# Altium footprint library mastermind.PCBLIB: 1061 footprints (part 19 of 67)
Each footprint in its own frame and in the unit in brackets; x right, y up, seen from the top. Pads: shape width x height; smd on the part's side, far side on the other; paste and mask are expansions set on the pad; w line width, h text height; cw(c..) or ccw(c..) is an arc to the next point about the centre after c.
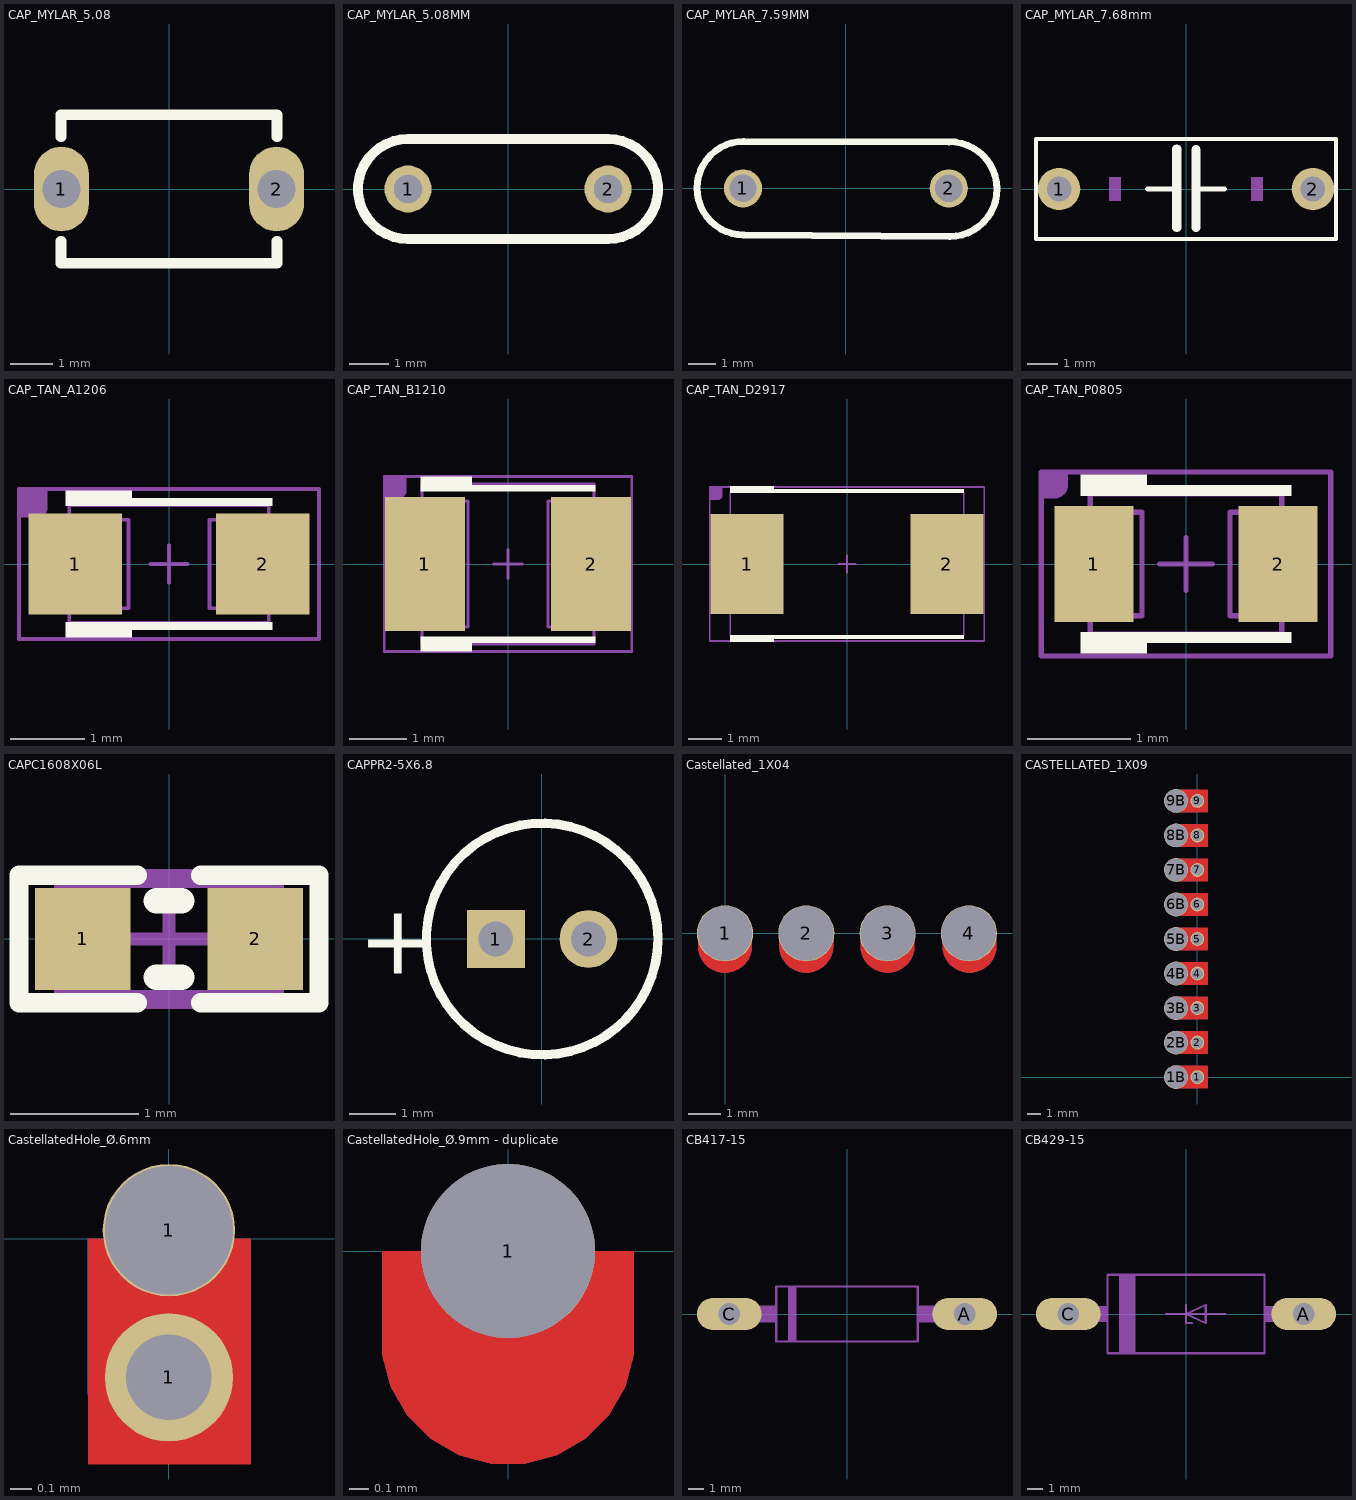
[diagram p18: the footprints below, top view; thin cyan lines are the x and y axes]

## CAP_MYLAR_5.08 [mm]
pads (2):
  oval 1.3x2 hole 0.9 paste-2539.97 mask+0.102: 1(-2.54,0) 2(2.54,0)
Top Overlay:
  lines w0.254: -2.55,-1.231 -2.55,-1.75 2.55,-1.75 2.55,-1.231 ; -2.55,1.231 -2.55,1.75 2.55,1.75 2.55,1.231

## CAP_MYLAR_5.08MM [mil]
pads (2):
  round 47 hole 28 slot 28.2 at 90 deg paste-99999 mask+2: 1(-100,0) 2(100,0)
Top Overlay:
  lines w10: -100,-50 cw(c-100,0) -100,50 100,50 cw(c100,0) 100,-50 -100,-50

## CAP_MYLAR_7.59MM [mil]
pads (2):
  round 55.7 hole 40 paste-99999 mask+2: 1(-150,0) 2(150,0)
Top Overlay:
  lines w10: -149.88,-68 151.06,-70.35 ; -149,68 150.35,67.65 ; -148.82,-67.94 cw(c-148.82,0.29) -148.82,68.53 ; 150.59,67.94 cw(c151.18,-1.18) 151.76,-70.29

## CAP_MYLAR_7.68mm [mm]
pads (2):
  round 1.4 hole 0.813: 1(-4.191,0) 2(4.191,0)
Top Overlay:
  lines w0.127: -4.953,-1.651 4.953,-1.651 4.953,1.651 -4.953,1.651 -4.953,-1.651
  lines w0.152: -1.27,0 -0.305,0 ; 0.33,0 1.27,0
  lines w0.305: -0.305,-1.27 -0.305,0 -0.305,1.321 ; 0.33,-1.27 0.33,0 0.33,1.295
Mechanical 8:
  region: 2.159,-0.381 2.159,0.381 2.54,0.381 2.54,-0.381
  region: -2.54,-0.381 -2.54,0.381 -2.159,0.381 -2.159,-0.381
3D body "User Library-Film Capacitor 6x8mm (1)1.STEP": height 13.72, standoff -2.26, extent -3.772,-1.651 3.772,1.349

## CAP_TAN_A1206 [mil]
height 70.87
pads (2):
  rect 50x54 smd: 1(-50,0) 2(50,0)
Top Overlay:
  region: 55,-35 -20,-35 -20,-39 -55,-39 -55,-31 55,-31
  region: 55,31 -55,31 -55,39 -20,39 -20,35 55,35
Mechanical 13:
  lines w2: -10,0 10,0 ; 0,-10 0,10 ; -63,-23.63 -63,23.62 -21.66,23.62 -21.66,-23.63 -63,-23.63 ; -53.16,-31.5 53.15,-31.5 53.15,31.5 -53.16,31.5 -53.16,-31.5 ; 21.65,-23.62 21.65,23.62 62.99,23.62 62.99,-23.62 21.65,-23.62
Mechanical 15:
  region: -80,40 -65,40 -65,30 -65,29.01 -65.76,27.17 -67.17,25.76 -69.01,25 -70,25 -80,25
  lines w2: -80,-40 -80,40 80,40 80,-40 -80,-40
3D body "CAPMP3216X180N.STEP": height 70.87, standoff 0, extent -62.99,-31.49 63,31.5

## CAP_TAN_B1210 [mil]
height 82.68
pads (2):
  rect 55.12x92 smd: 1(-57,0) 2(57,0)
Top Overlay:
  region: 60,50 -60,50 -60,60 -25,60 -25,54 60,54
  region: 60,-54 -25,-54 -25,-60 -60,-60 -60,-50 60,-50
Mechanical 13:
  lines w2: -10,0 10,0 ; 0,-10 0,10 ; -68.89,-43.3 -27.55,-43.3 -27.55,43.31 -68.89,43.31 -68.89,-43.3 ; -59.06,-55.11 -59.06,55.12 59.05,55.12 59.05,-55.11 -59.06,-55.11 ; 27.56,-43.31 27.56,43.31 68.9,43.31 68.9,-43.31 27.56,-43.31
Mechanical 14:
  region: -85,60 -70,60 -70,50 -70,49.01 -70.76,47.17 -72.17,45.76 -74.01,45 -75,45 -85,45
  lines w2: -85,-60 85,-60 85,60 -85,60 -85,-60
3D body "CAPMP3528X210N.STEP": height 82.68, standoff 0, extent -68.89,-55.11 68.91,55.13

## CAP_TAN_D2917 [mm]
height 3.1
pads (2):
  rect 2.2x3 smd: 1(-2.997,0) 2(2.997,0)
Top Overlay:
  region: 3.5,-2.235 -2.2,-2.235 -2.2,-2.337 -3.5,-2.337 -3.5,-2.134 3.5,-2.134
  region: 3.5,2.134 -3.5,2.134 -3.5,2.337 -2.2,2.337 -2.2,2.235 3.5,2.235
Mechanical 13:
  lines w0.051: -0.254,0 0.254,0 ; 0,-0.254 0,0.254 ; -3.65,-1.2 -3.65,1.2 -2.2,1.2 -2.2,-1.2 -3.65,-1.2 ; -3.5,-2.15 3.5,-2.15 3.5,2.15 -3.5,2.15 -3.5,-2.15 ; 2.2,-1.2 3.65,-1.2 3.65,1.2 2.2,1.2 2.2,-1.2
Mechanical 14:
  region: -4.115,2.311 -3.734,2.311 -3.734,2.057 -3.734,2.032 -3.753,1.985 -3.789,1.95 -3.836,1.93 -3.861,1.93 -4.115,1.93
  lines w0.051: -4.115,-2.311 4.115,-2.311 4.115,2.311 -4.115,2.311 -4.115,-2.311
3D body "CAPMP7343X310N.STEP": height 3.1, standoff 0, extent -3.8,-1.975 3.8,1.975

## CAP_TAN_P0805 [mil]
height 59.06
pads (2):
  rect 30x44 smd: 1(-35,0) 2(35,0)
Top Overlay:
  region: 40,-30 -15,-30 -15,-34 -40,-34 -40,-26 40,-26
  region: 40,26 -40,26 -40,34 -15,34 -15,30 40,30
Mechanical 13:
  lines w2: -10,0 10,0 ; 0,-10 0,10 ; -40.35,-19.68 -40.35,19.68 -16.73,19.68 -16.73,-19.68 -40.35,-19.68 ; -36.42,-26.57 36.42,-26.57 36.42,26.57 -36.42,26.57 -36.42,-26.57 ; 16.73,-19.68 16.73,19.68 40.35,19.68 40.35,-19.68 16.73,-19.68
Mechanical 14:
  region: -55,35 -45,35 -45,30 -45,29.01 -45.76,27.17 -47.17,25.76 -49.01,25 -50,25 -55,25
  lines w2: -55,-35 -55,35 55,35 55,-35 -55,-35
  text ".Designator" at -30,-20 h80
3D body "CAPMP2012X150N.STEP": height 59.06, standoff 0, extent -40.35,-26.57 40.36,26.58

## CAPC1608X06L [mm]
pads (2):
  rect 0.75x0.8 smd: 1(-0.675,0) 2(0.675,0)
Top Overlay:
  lines w0.152: -0.25,-0.5 -1.175,-0.5 -1.175,0.5 -0.25,0.5 ; 0.25,-0.5 1.175,-0.5 1.175,0.5 0.25,0.5
  lines w0.2: -0.1,-0.3 0.1,-0.3 ; -0.1,0.3 0.1,0.3
Mechanical 13:
  lines w0.1: -0.85,-0.45 0.85,-0.45 0.85,0.45 -0.85,0.45 -0.85,-0.45
Mechanical 15:
  lines w0.1: -0.45,0 0.45,0 ; 0,-0.45 0,0.45 ; -1.175,-0.5 -1.175,0.5 1.175,0.5 1.175,-0.5 -1.175,-0.5
3D body "User Library-Chip Capacitor 0603.step": height 0.8, standoff 0, extent -0.8,-0.43 0.8,0.43

## CAPPR2-5X6.8 [mm]
pads (2):
  rect 1.25x1.25 hole 0.75: 1(-0.994,-0.009)
  round 1.25 hole 0.75: 2(1.006,-0.009)
Top Overlay:
  circle w0.2: c0.006,-0.009 r2.5
  text "+" at -3.969,-0.759 h1.5
3D body: height 10.16, standoff 0, extent -2.493,-2.508 2.506,2.49

## Castellated_1X04 [mm]
pads (4):
  round 1.75 hole 1.7: 1(0,0) 2(2.54,0) 3(5.08,0) 4(7.62,0)
Top Layer:
  region: -0.838,0 -0.838,-0.449 -0.833,-0.528 -0.793,-0.68 -0.726,-0.823 -0.632,-0.95 -0.516,-1.057 -0.382,-1.14 -0.235,-1.197 -0.079,-1.224 0,-1.223 0.078,-1.222 0.232,-1.192 0.378,-1.134 0.51,-1.051 0.625,-0.944 0.719,-0.819 0.789,-0.678 0.831,-0.527 0.838,-0.449 0.838,0
  region: 1.702,0 1.702,-0.449 1.707,-0.528 1.747,-0.68 1.814,-0.823 1.908,-0.95 2.024,-1.057 2.158,-1.14 2.305,-1.197 2.461,-1.224 2.54,-1.223 2.618,-1.222 2.772,-1.192 2.918,-1.134 3.05,-1.051 3.165,-0.944 3.259,-0.819 3.329,-0.678 3.371,-0.527 3.378,-0.449 3.378,0
  region: 4.242,0 4.242,-0.449 4.247,-0.528 4.287,-0.68 4.354,-0.823 4.448,-0.95 4.564,-1.057 4.698,-1.14 4.845,-1.197 5.001,-1.224 5.08,-1.223 5.158,-1.222 5.312,-1.192 5.458,-1.134 5.59,-1.051 5.705,-0.944 5.799,-0.819 5.869,-0.678 5.911,-0.527 5.918,-0.449 5.918,0
  region: 6.802,0 6.802,-0.449 6.807,-0.528 6.847,-0.68 6.915,-0.823 7.009,-0.95 7.124,-1.057 7.259,-1.14 7.406,-1.197 7.561,-1.224 7.64,-1.223 7.719,-1.222 7.872,-1.192 8.018,-1.134 8.151,-1.051 8.266,-0.944 8.36,-0.819 8.429,-0.678 8.472,-0.527 8.479,-0.449 8.479,0
Bottom Layer:
  region: 4.242,0 4.242,-0.449 4.247,-0.528 4.287,-0.68 4.354,-0.823 4.448,-0.95 4.564,-1.057 4.698,-1.14 4.845,-1.197 5.001,-1.224 5.08,-1.223 5.158,-1.222 5.312,-1.192 5.458,-1.134 5.59,-1.051 5.705,-0.944 5.799,-0.819 5.869,-0.678 5.911,-0.527 5.918,-0.449 5.918,0
  region: 6.802,0 6.802,-0.449 6.807,-0.528 6.847,-0.68 6.915,-0.823 7.009,-0.95 7.124,-1.057 7.259,-1.14 7.406,-1.197 7.561,-1.224 7.64,-1.223 7.719,-1.222 7.872,-1.192 8.018,-1.134 8.151,-1.051 8.266,-0.944 8.36,-0.819 8.429,-0.678 8.472,-0.527 8.479,-0.449 8.479,0
  region: 1.702,0 1.702,-0.449 1.707,-0.528 1.747,-0.68 1.814,-0.823 1.908,-0.95 2.024,-1.057 2.158,-1.14 2.305,-1.197 2.461,-1.224 2.54,-1.223 2.618,-1.222 2.772,-1.192 2.918,-1.134 3.05,-1.051 3.165,-0.944 3.259,-0.819 3.329,-0.678 3.371,-0.527 3.378,-0.449 3.378,0
  region: -0.838,0.206 -0.838,-0.449 -0.833,-0.528 -0.793,-0.68 -0.726,-0.823 -0.632,-0.95 -0.516,-1.057 -0.382,-1.14 -0.235,-1.197 -0.079,-1.224 0,-1.223 0.078,-1.222 0.232,-1.192 0.378,-1.134 0.51,-1.051 0.625,-0.944 0.719,-0.819 0.789,-0.678 0.831,-0.527 0.838,-0.449 0.838,0.206
Top Solder:
  region: 6.822,0 6.822,-0.45 6.827,-0.529 6.867,-0.682 6.934,-0.824 7.028,-0.952 7.144,-1.059 7.278,-1.142 7.425,-1.198 7.581,-1.226 7.66,-1.225 7.738,-1.224 7.892,-1.194 8.038,-1.136 8.17,-1.052 8.285,-0.946 8.379,-0.82 8.449,-0.68 8.491,-0.529 8.498,-0.451 8.498,0
  region: -0.838,0 -0.838,-0.449 -0.833,-0.528 -0.793,-0.681 -0.725,-0.823 -0.632,-0.951 -0.516,-1.058 -0.382,-1.141 -0.234,-1.197 -0.079,-1.225 0,-1.224 0.079,-1.223 0.232,-1.193 0.378,-1.135 0.511,-1.051 0.626,-0.945 0.72,-0.819 0.789,-0.679 0.832,-0.528 0.839,-0.45 0.839,0
  region: 1.702,0 1.702,-0.436 1.707,-0.515 1.747,-0.667 1.814,-0.81 1.908,-0.937 2.024,-1.044 2.158,-1.127 2.305,-1.184 2.461,-1.211 2.54,-1.21 2.618,-1.209 2.772,-1.179 2.918,-1.121 3.05,-1.038 3.165,-0.931 3.259,-0.806 3.329,-0.665 3.371,-0.514 3.378,-0.436 3.378,0
  region: 4.242,0 4.242,-0.449 4.247,-0.528 4.287,-0.681 4.355,-0.823 4.448,-0.951 4.564,-1.058 4.698,-1.141 4.846,-1.197 5.001,-1.225 5.08,-1.224 5.159,-1.223 5.312,-1.193 5.458,-1.135 5.591,-1.051 5.706,-0.945 5.8,-0.819 5.869,-0.679 5.912,-0.528 5.919,-0.45 5.919,0
Bottom Solder:
  region: -0.838,0 -0.838,-0.449 -0.833,-0.528 -0.793,-0.681 -0.725,-0.823 -0.632,-0.951 -0.516,-1.058 -0.382,-1.141 -0.234,-1.197 -0.079,-1.225 0,-1.224 0.079,-1.223 0.232,-1.193 0.378,-1.135 0.511,-1.051 0.626,-0.945 0.72,-0.819 0.789,-0.679 0.832,-0.528 0.839,-0.45 0.839,0
  region: 1.702,0 1.702,-0.436 1.707,-0.515 1.747,-0.667 1.814,-0.81 1.908,-0.937 2.024,-1.044 2.158,-1.127 2.305,-1.184 2.461,-1.211 2.54,-1.21 2.618,-1.209 2.772,-1.179 2.918,-1.121 3.05,-1.038 3.165,-0.931 3.259,-0.806 3.329,-0.665 3.371,-0.514 3.378,-0.436 3.378,0
  region: 6.822,0 6.822,-0.45 6.827,-0.529 6.867,-0.682 6.934,-0.824 7.028,-0.952 7.144,-1.059 7.278,-1.142 7.425,-1.198 7.581,-1.226 7.66,-1.225 7.738,-1.224 7.892,-1.194 8.038,-1.136 8.17,-1.052 8.285,-0.946 8.379,-0.82 8.449,-0.68 8.491,-0.529 8.498,-0.451 8.498,0
  region: 4.242,0 4.242,-0.449 4.247,-0.528 4.287,-0.681 4.355,-0.823 4.448,-0.951 4.564,-1.058 4.698,-1.141 4.846,-1.197 5.001,-1.225 5.08,-1.224 5.159,-1.223 5.312,-1.193 5.458,-1.135 5.591,-1.051 5.706,-0.945 5.8,-0.819 5.869,-0.679 5.912,-0.528 5.919,-0.45 5.919,0

## CASTELLATED_1X09 [mil] "1X09_CASTELLATED"
pads (18):
  round 40 hole 33.46: 1(0,0) 2(0,100) 3(0,200) 4(0,300) 5(0,400) 6(0,500) 7(0,600) 8(0,700) 9(0,800)
  round 68.9 hole 66.93: 1B(-61.81,0) 2B(-61.81,100) 3B(-61.81,200) 4B(-61.81,300) 5B(-61.81,400) 6B(-61.81,500) 7B(-61.81,600) 8B(-61.81,700) 9B(-61.81,800)
Top Layer:
  region: -50.5,33 30.5,33 30.5,0 30.5,-33 -50.5,-33
  region: -50.5,133 30.5,133 30.5,100 30.5,67 -50.5,67
  region: -50.5,333 30.5,333 30.5,300 30.5,267 -50.5,267
  region: -50.5,233 30.5,233 30.5,200 30.5,167 -50.5,167
  region: -50.5,433 30.5,433 30.5,400 30.5,367 -50.5,367
  region: -50.5,833 30.5,833 30.5,800 30.5,767 -50.5,767
  region: -50.5,533 30.5,533 30.5,500 30.5,467 -50.5,467
  region: -50.5,733 30.5,733 30.5,700 30.5,667 -50.5,667
  region: -50.5,633 30.5,633 30.5,600 30.5,567 -50.5,567
Bottom Layer:
  region: -50.5,-33 0.02,-33 3.12,-32.8 9.13,-31.24 14.74,-28.57 19.75,-24.89 23.96,-20.32 27.24,-15.04 29.46,-9.24 30.55,-3.12 30.5,-0.02 30.47,3.07 29.27,9.13 26.99,14.86 23.71,20.09 19.52,24.62 14.57,28.32 9.04,31.05 3.1,32.72 0.02,33 -50.5,33
  region: -50.5,67 0.02,67 3.12,67.2 9.13,68.76 14.74,71.43 19.75,75.11 23.96,79.68 27.24,84.96 29.46,90.76 30.55,96.88 30.5,99.98 30.47,103.07 29.27,109.13 26.99,114.86 23.71,120.09 19.52,124.62 14.57,128.32 9.04,131.05 3.1,132.72 0.02,133 -50.5,133
  region: -50.5,267 0.02,267 3.12,267.2 9.13,268.76 14.74,271.43 19.75,275.11 23.96,279.68 27.24,284.96 29.46,290.76 30.55,296.88 30.5,299.98 30.47,303.07 29.27,309.13 26.99,314.86 23.71,320.09 19.52,324.62 14.57,328.32 9.04,331.05 3.1,332.72 0.02,333 -50.5,333
  region: -50.5,167 0.02,167 3.12,167.2 9.13,168.76 14.74,171.43 19.75,175.11 23.96,179.68 27.24,184.96 29.46,190.76 30.55,196.88 30.5,199.98 30.47,203.07 29.27,209.13 26.99,214.86 23.71,220.09 19.52,224.62 14.57,228.32 9.04,231.05 3.1,232.72 0.02,233 -50.5,233
  region: -50.5,367 0.02,367 3.12,367.2 9.13,368.76 14.74,371.43 19.75,375.11 23.96,379.68 27.24,384.96 29.46,390.76 30.55,396.88 30.5,399.98 30.47,403.07 29.27,409.13 26.99,414.86 23.71,420.09 19.52,424.62 14.57,428.32 9.04,431.05 3.1,432.72 0.02,433 -50.5,433
  region: -50.5,767 0.02,767 3.12,767.2 9.13,768.76 14.74,771.43 19.75,775.11 23.96,779.68 27.24,784.96 29.46,790.76 30.55,796.88 30.5,799.98 30.47,803.07 29.27,809.13 26.99,814.86 23.71,820.09 19.52,824.62 14.57,828.32 9.04,831.05 3.1,832.72 0.02,833 -50.5,833
  region: -50.5,467 0.02,467 3.12,467.2 9.13,468.76 14.74,471.43 19.75,475.11 23.96,479.68 27.24,484.96 29.46,490.76 30.55,496.88 30.5,499.98 30.47,503.07 29.27,509.13 26.99,514.86 23.71,520.09 19.52,524.62 14.57,528.32 9.04,531.05 3.1,532.72 0.02,533 -50.5,533
  region: -50.5,667 0.02,667 3.12,667.2 9.13,668.76 14.74,671.43 19.75,675.11 23.96,679.68 27.24,684.96 29.46,690.76 30.55,696.88 30.5,699.98 30.47,703.07 29.27,709.13 26.99,714.86 23.71,720.09 19.52,724.62 14.57,728.32 9.04,731.05 3.1,732.72 0.02,733 -50.5,733
  region: -50.5,567 0.02,567 3.12,567.2 9.13,568.76 14.74,571.43 19.75,575.11 23.96,579.68 27.24,584.96 29.46,590.76 30.55,596.88 30.5,599.98 30.47,603.07 29.27,609.13 26.99,614.86 23.71,620.09 19.52,624.62 14.57,628.32 9.04,631.05 3.1,632.72 0.02,633 -50.5,633
Top Solder:
  region: -50.5,33 30.5,33 30.5,0 30.5,-33 -50.5,-33
  region: -50.5,133 30.5,133 30.5,100 30.5,67 -50.5,67
  region: -50.5,333 30.5,333 30.5,300 30.5,267 -50.5,267
  region: -50.5,233 30.5,233 30.5,200 30.5,167 -50.5,167
  region: -50.5,433 30.5,433 30.5,400 30.5,367 -50.5,367
  region: -50.5,833 30.5,833 30.5,800 30.5,767 -50.5,767
  region: -50.5,533 30.5,533 30.5,500 30.5,467 -50.5,467
  region: -50.5,733 30.5,733 30.5,700 30.5,667 -50.5,667
  region: -50.5,633 30.5,633 30.5,600 30.5,567 -50.5,567
Bottom Solder:
  drawing of 9 lines, arcs and shapes, not listed
Mechanical 3:
  region: 10,-10 -10,-10 -10,10 10,10
  region: 10,90 -10,90 -10,110 10,110
  region: 10,190 -10,190 -10,210 10,210
  region: 10,290 -10,290 -10,310 10,310
  region: 10,390 -10,390 -10,410 10,410
  region: 10,790 -10,790 -10,810 10,810
  region: 10,490 -10,490 -10,510 10,510
  region: 10,590 -10,590 -10,610 10,610
  region: 10,690 -10,690 -10,710 10,710

## CastellatedHole_Ø.6mm [mm]
pads (2):
  round 0.6 hole 0.4 paste-2539.97 mask+0: 1(0,-0.649)
  round 0.62 hole 0.6 paste-2539.97 mask+0: 1(0,0.04)
Top Layer:
  region: -0.378,-1.054 0.383,-1.054 0.383,0 -0.378,0
Bottom Layer:
  region: -0.383,-0.649 -0.383,-0.725 -0.324,-0.865 -0.217,-0.973 -0.076,-1.031 0.076,-1.031 0.217,-0.973 0.324,-0.865 0.382,-0.725 0.382,-0.649 0.383,-0.649 0.383,0 -0.382,0 -0.382,-0.649

## CastellatedHole_Ø.9mm - duplicate [mm]
pads (1):
  round 0.9 hole 0.9 paste-2539.97 mask+0: 1(0,0)
Top Layer:
  region: -0.651,-0.45 -0.651,-0.536 -0.606,-0.701 -0.521,-0.849 -0.4,-0.97 -0.251,-1.056 -0.086,-1.1 0.085,-1.1 0.25,-1.056 0.399,-0.97 0.52,-0.849 0.605,-0.701 0.649,-0.536 0.649,-0.45 0.649,0 0.439,0 0.431,-0.086 0.365,-0.244 0.244,-0.366 0.085,-0.431 -0.086,-0.431 -0.245,-0.366 -0.366,-0.244 -0.432,-0.086 -0.441,0 -0.651,0
Bottom Layer:
  region: -0.651,-0.45 -0.651,-0.536 -0.606,-0.701 -0.521,-0.849 -0.4,-0.97 -0.251,-1.056 -0.086,-1.1 0.085,-1.1 0.25,-1.056 0.399,-0.97 0.52,-0.849 0.605,-0.701 0.649,-0.536 0.649,-0.45 0.649,0 0.439,0 0.431,-0.086 0.365,-0.244 0.244,-0.366 0.085,-0.431 -0.086,-0.431 -0.245,-0.366 -0.366,-0.244 -0.432,-0.086 -0.441,0 -0.651,0

## CB417-15 [mil]
pads (2):
  oval 165x82.5 hole 55: A(300,0) C(-300,0)
Mechanical 2:
  region: -245,-21 -245,21 -180,21 -180,-21
  region: 180,-21 180,21 245,21 245,-21
  region: -150,-70 -150,70 -130,70 -130,-70
  lines w6: -180,-70 180,-70 180,70 -180,70 -180,-70
Mechanical 8:
  lines w44: -300,0 -250,0 ; 250,0 300,0

## CB429-15 [mil]
pads (2):
  oval 165x82.5 hole 55: A(300,0) C(-300,0)
Mechanical 2:
  region: 200,-20 200,20 235,20 235,-20
  region: -235,-20 -235,20 -200,20 -200,-20
  region: -170,-100 -170,100 -130,100 -130,-100
  lines w6: -50,0 0,0 ; 0,23 0,0 ; 15,-23 0,-23 0,0 ; 100,0 0,0 ; 0,0 50,-23 50,23 0,0 ; -200,-100 200,-100 200,100 -200,100 -200,-100
Mechanical 8:
  lines w40: -300,0 -240,0 ; 240,0 300,0